# Altium footprint library 13-IC Packages-1bga.PcbLib: 97 footprints (part 2 of 14) (continued)
## BGA78C80P9X13_900X1150X120 [mm] "BGA 0.8mm, Pitch, Square 78 Pin, 9 Columns x 13 Rows, Body 11.5mm X 9mm X 1.2mm H"
height 1.2
pads (80):
  round 0.4 smd: A1(-3.2,4.8) A2(-2.4,4.8) A3(-1.6,4.8) A7(1.6,4.8) A8(2.4,4.8) A9(3.2,4.8) B1(-3.2,4) B2(-2.4,4) B3(-1.6,4) B7(1.6,4) B8(2.4,4) B9(3.2,4) C1(-3.2,3.2) C2(-2.4,3.2) C3(-1.6,3.2) C7(1.6,3.2) C8(2.4,3.2) C9(3.2,3.2) D1(-3.2,2.4) D2(-2.4,2.4) D3(-1.6,2.4) D7(1.6,2.4) D8(2.4,2.4) D9(3.2,2.4) E1(-3.2,1.6) E2(-2.4,1.6) E3(-1.6,1.6) E7(1.6,1.6) E8(2.4,1.6) E9(3.2,1.6) F1(-3.2,0.8) F2(-2.4,0.8) F3(-1.6,0.8) F7(1.6,0.8) F8(2.4,0.8) F9(3.2,0.8) G1(-3.2,0) G2(-2.4,0) G3(-1.6,0) G7(1.6,0) G8(2.4,0) G9(3.2,0) H1(-3.2,-0.8) H2(-2.4,-0.8) H3(-1.6,-0.8) H7(1.6,-0.8) H8(2.4,-0.8) H9(3.2,-0.8) J1(-3.2,-1.6) J2(-2.4,-1.6) J3(-1.6,-1.6) J7(1.6,-1.6) J8(2.4,-1.6) J9(3.2,-1.6) K1(-3.2,-2.4) K2(-2.4,-2.4) K3(-1.6,-2.4) K7(1.6,-2.4) K8(2.4,-2.4) K9(3.2,-2.4) L1(-3.2,-3.2) L2(-2.4,-3.2) L3(-1.6,-3.2) L7(1.6,-3.2) L8(2.4,-3.2) L9(3.2,-3.2) M1(-3.2,-4) M2(-2.4,-4) M3(-1.6,-4) M7(1.6,-4) M8(2.4,-4) M9(3.2,-4) N1(-3.2,-4.8) N2(-2.4,-4.8) N3(-1.6,-4.8) N7(1.6,-4.8) N8(2.4,-4.8) N9(3.2,-4.8)
  round 1 smd paste-0.51 mask+0.5: FTG1(-5.5,-6.75) FTG2(5.5,6.75)
Top Layer keep-out:
  circle w0.1: c5.5,6.75 r1
  circle w0.1: c-5.5,-6.75 r1
Top Overlay:
  circle w0.25: c-5.1,4.8 r0.125
  lines w0.2: -4.5,4.75 -3.5,5.75 ; -4.5,4.95 -3.7,5.75 ; -4.5,5.15 -3.9,5.75 ; -4.5,5.35 -4.1,5.75 ; -4.5,5.55 -4.3,5.75 ; -4.5,-5.75 -4.5,5.75 4.5,5.75 4.5,-5.75 -4.5,-5.75
Mechanical 14:
  lines w0.1: -4.5,4.75 -3.5,5.75 ; -4.5,4.85 -3.6,5.75 ; -4.5,4.95 -3.7,5.75 ; -4.5,5.05 -3.8,5.75 ; -4.5,5.15 -3.9,5.75 ; -4.5,5.25 -4,5.75 ; -4.5,5.35 -4.1,5.75 ; -4.5,5.45 -4.2,5.75 ; -4.5,5.55 -4.3,5.75 ; -4.5,5.65 -4.4,5.75 ; -4.5,-5.75 4.5,-5.75 4.5,5.75 -4.5,5.75 -4.5,-5.75
  text "9" at 3.075,6.075 h0.4
  text "8" at 2.275,6.075 h0.4
  text "7" at 1.475,6.075 h0.4
  text "3" at -1.725,6.075 h0.4
  text "2" at -2.525,6.075 h0.4
  text "1" at -3.325,6.075 h0.4
  text "J" at -4,-1.8 h0.4
  text "N" at -4,-5 h0.4
  text "A" at -4,4.6 h0.4
  text "B" at -4,3.8 h0.4
  text "C" at -4,3 h0.4
  text "D" at -4,2.2 h0.4
  text "E" at -4,1.4 h0.4
  text "F" at -4,0.6 h0.4
  text "G" at -4,-0.2 h0.4
  text "H" at -4,-1 h0.4
  text "M" at -4,-4.2 h0.4
  text "K" at -4,-2.6 h0.4
  text "L" at -4,-3.4 h0.4
Mechanical 15:
  lines w0.05: -0.5,0 0.5,0 ; 0,-0.5 0,0.5 ; -5.5,-6.75 5.5,-6.75 5.5,6.75 -5.5,6.75 -5.5,-6.75
3D body "BGA78C80P9X13_900X1150X120.stp": height 1.2, standoff -0.05, extent -4.5,-5.75 4.5,5.75

## BGA84C80P9X15_800X1250X120 [mm] "BGA, 0.80mm pitch, Rect.; 84 Pin, 9 Columns X 15 Rows, 8.00mm X 12.50mm X 1.20mm H"
height 1.2
pads (86):
  round 0.4 smd: A1(-3.2,5.6) A2(-2.4,5.6) A3(-1.6,5.6) A7(1.6,5.6) A8(2.4,5.6) A9(3.2,5.6) B1(-3.2,4.8) B2(-2.4,4.8) B3(-1.6,4.8) B7(1.6,4.8) B8(2.4,4.8) B9(3.2,4.8) C1(-3.2,4) C2(-2.4,4) C3(-1.6,4) C7(1.6,4) C8(2.4,4) C9(3.2,4) D1(-3.2,3.2) D2(-2.4,3.2) D3(-1.6,3.2) D7(1.6,3.2) D8(2.4,3.2) D9(3.2,3.2) E1(-3.2,2.4) E2(-2.4,2.4) E3(-1.6,2.4) E7(1.6,2.4) E8(2.4,2.4) E9(3.2,2.4) F1(-3.2,1.6) F2(-2.4,1.6) F3(-1.6,1.6) F7(1.6,1.6) F8(2.4,1.6) F9(3.2,1.6) G1(-3.2,0.8) G2(-2.4,0.8) G3(-1.6,0.8) G7(1.6,0.8) G8(2.4,0.8) G9(3.2,0.8) H1(-3.2,0) H2(-2.4,0) H3(-1.6,0) H7(1.6,0) H8(2.4,0) H9(3.2,0) J1(-3.2,-0.8) J2(-2.4,-0.8) J3(-1.6,-0.8) J7(1.6,-0.8) J8(2.4,-0.8) J9(3.2,-0.8) K2(-2.4,-1.6) K3(-1.6,-1.6) K7(1.6,-1.6) K8(2.4,-1.6) K9(3.2,-1.6) L1(-3.2,-2.4) L2(-2.4,-2.4) L3(-1.6,-2.4) L7(1.6,-2.4) L8(2.4,-2.4) M2(-2.4,-3.2) M3(-1.6,-3.2) M7(1.6,-3.2) M8(2.4,-3.2) M9(3.2,-3.2) N1(-3.2,-4) N2(-2.4,-4) N3(-1.6,-4) N7(1.6,-4) N8(2.4,-4) P2(-2.4,-4.8) P3(-1.6,-4.8) P7(1.6,-4.8) P8(2.4,-4.8) P9(3.2,-4.8) R1(-3.2,-5.6) R2(-2.4,-5.6) R3(-1.6,-5.6) R7(1.6,-5.6) R8(2.4,-5.6)
  round 1 smd paste-0.51 mask+0.5: FTG1(-4.85,-7.1) FTG2(4.85,7.1)
Top Layer keep-out:
  circle w0.1: c-4.85,-7.1 r1
  circle w0.1: c4.85,7.1 r1
Top Overlay:
  circle w0.25: c-4.6,5.6 r0.125
  lines w0.2: -4,-6.25 4,-6.25 4,6.25 -4,6.25 -4,-6.25
Mechanical 14:
  lines w0.1: -4,5.25 -3,6.25 ; -4,5.35 -3.1,6.25 ; -4,5.45 -3.2,6.25 ; -4,5.55 -3.3,6.25 ; -4,5.65 -3.4,6.25 ; -4,5.75 -3.5,6.25 ; -4,5.85 -3.6,6.25 ; -4,5.95 -3.7,6.25 ; -4,6.05 -3.8,6.25 ; -4,6.15 -3.9,6.25 ; -4,-6.25 4,-6.25 4,6.25 -4,6.25 -4,-6.25
Mechanical 15:
  circle w0.05: c0,0 r0.35
  lines w0.05: -0.5,0 0.5,0 ; 0,-0.5 0,0.5 ; -5.05,-7.3 5.05,-7.3 5.05,7.3 -5.05,7.3 -5.05,-7.3
3D body "BGA84C80P9X15_800X1250X120.stp": height 1.2, standoff 0, extent -4,-6.25 4,6.25

## BGA84C80P9X15_1400X800X120 [mm] "BGA 0.8mm, Pitch, Square 84 Pin, 9 Columns x 15 Rows, Body 14mm X 8mm X 1.2mm H"
height 1.2
pads (86):
  round 0.4 smd: A1(-3.2,5.6) A2(-2.4,5.6) A3(-1.6,5.6) A7(1.6,5.6) A8(2.4,5.6) A9(3.2,5.6) B1(-3.2,4.8) B2(-2.4,4.8) B3(-1.6,4.8) B7(1.6,4.8) B8(2.4,4.8) B9(3.2,4.8) C1(-3.2,4) C2(-2.4,4) C3(-1.6,4) C7(1.6,4) C8(2.4,4) C9(3.2,4) D1(-3.2,3.2) D2(-2.4,3.2) D3(-1.6,3.2) D7(1.6,3.2) D8(2.4,3.2) D9(3.2,3.2) E1(-3.2,2.4) E2(-2.4,2.4) E3(-1.6,2.4) E7(1.6,2.4) E8(2.4,2.4) E9(3.2,2.4) F1(-3.2,1.6) F2(-2.4,1.6) F3(-1.6,1.6) F7(1.6,1.6) F8(2.4,1.6) F9(3.2,1.6) G1(-3.2,0.8) G2(-2.4,0.8) G3(-1.6,0.8) G7(1.6,0.8) G8(2.4,0.8) G9(3.2,0.8) H1(-3.2,0) H2(-2.4,0) H3(-1.6,0) H7(1.6,0) H8(2.4,0) H9(3.2,0) J1(-3.2,-0.8) J2(-2.4,-0.8) J3(-1.6,-0.8) J7(1.6,-0.8) J8(2.4,-0.8) J9(3.2,-0.8) K2(-2.4,-1.6) K3(-1.6,-1.6) K7(1.6,-1.6) K8(2.4,-1.6) K9(3.2,-1.6) L1(-3.2,-2.4) L2(-2.4,-2.4) L3(-1.6,-2.4) L7(1.6,-2.4) L8(2.4,-2.4) M2(-2.4,-3.2) M3(-1.6,-3.2) M7(1.6,-3.2) M8(2.4,-3.2) M9(3.2,-3.2) N1(-3.2,-4) N2(-2.4,-4) N3(-1.6,-4) N7(1.6,-4) N8(2.4,-4) P2(-2.4,-4.8) P3(-1.6,-4.8) P7(1.6,-4.8) P8(2.4,-4.8) P9(3.2,-4.8) R1(-3.2,-5.6) R2(-2.4,-5.6) R3(-1.6,-5.6) R7(1.6,-5.6) R8(2.4,-5.6)
  round 1 smd paste-0.51 mask+0.5: FTG1(-5,-8) FTG2(5,8)
Top Layer keep-out:
  circle w0.1: c-5,-8 r1
  circle w0.1: c5,8 r1
Top Overlay:
  circle w0.25: c-4.5,6.5 r0.125
  region: -3,7 -4,6 -4,7
  lines w0.2: -4,6 -3,7 ; -4,-7 4,-7 4,7 -4,7 -4,-7
Mechanical 14:
  circle w0.25: c-4.5,6.5 r0.125
  region: -3,7 -4,6 -4,7
  lines w0.1: -4,-7 4,-7 4,7 -4,7 -4,-7
  text "L" at -4.5,-2.4 h0.4
  text "K" at -4.5,-1.6 h0.4
  text "M" at -4.5,-3.2 h0.4
  text "H" at -4.5,0 h0.4
  text "G" at -4.5,0.8 h0.4
  text "F" at -4.5,1.6 h0.4
  text "E" at -4.5,2.4 h0.4
  text "D" at -4.5,3.2 h0.4
  text "C" at -4.5,4 h0.4
  text "B" at -4.5,4.8 h0.4
  text "A" at -4.5,5.6 h0.4
  text "N" at -4.5,-4 h0.4
  text "P" at -4.5,-4.8 h0.4
  text "R" at -4.5,-5.6 h0.4
  text "J" at -4.5,-0.8 h0.4
  text "1" at -3.325,7.175 h0.4
  text "2" at -2.525,7.175 h0.4
  text "3" at -1.725,7.175 h0.4
  text "7" at 1.475,7.175 h0.4
  text "8" at 2.275,7.175 h0.4
  text "9" at 3.075,7.175 h0.4
Mechanical 15:
  lines w0.05: -5,-8 5,-8 5,8 -5,8 -5,-8
3D body "BGA84C80P9X15_1400X800X120.stp": height 1.2, standoff 0, extent -4.075,-7.075 4.075,7.075

## BGA96C80P9X16_800X1400X120 [mm] "BGA, 0.80mm Pitch, Rect.; 96 Pin, 9 Columns X 16 Rows, 8.00mm X 14.00mm X 1.20mm H"
height 1.2
pads (98):
  round 0.4 smd: A1(-3.2,6) A2(-2.4,6) A3(-1.6,6) A7(1.6,6) A8(2.4,6) A9(3.2,6) B1(-3.2,5.2) B2(-2.4,5.2) B3(-1.6,5.2) B7(1.6,5.2) B8(2.4,5.2) B9(3.2,5.2) C1(-3.2,4.4) C2(-2.4,4.4) C3(-1.6,4.4) C7(1.6,4.4) C8(2.4,4.4) C9(3.2,4.4) D1(-3.2,3.6) D2(-2.4,3.6) D3(-1.6,3.6) D7(1.6,3.6) D8(2.4,3.6) D9(3.2,3.6) E1(-3.2,2.8) E2(-2.4,2.8) E3(-1.6,2.8) E7(1.6,2.8) E8(2.4,2.8) E9(3.2,2.8) F1(-3.2,2) F2(-2.4,2) F3(-1.6,2) F7(1.6,2) F8(2.4,2) F9(3.2,2) G1(-3.2,1.2) G2(-2.4,1.2) G3(-1.6,1.2) G7(1.6,1.2) G8(2.4,1.2) G9(3.2,1.2) H1(-3.2,0.4) H2(-2.4,0.4) H3(-1.6,0.4) H7(1.6,0.4) H8(2.4,0.4) H9(3.2,0.4) J1(-3.2,-0.4) J2(-2.4,-0.4) J3(-1.6,-0.4) J7(1.6,-0.4) J8(2.4,-0.4) J9(3.2,-0.4) K1(-3.2,-1.2) K2(-2.4,-1.2) K3(-1.6,-1.2) K7(1.6,-1.2) K8(2.4,-1.2) K9(3.2,-1.2) L1(-3.2,-2) L2(-2.4,-2) L3(-1.6,-2) L7(1.6,-2) L8(2.4,-2) L9(3.2,-2) M1(-3.2,-2.8) M2(-2.4,-2.8) M3(-1.6,-2.8) M7(1.6,-2.8) M8(2.4,-2.8) M9(3.2,-2.8) N1(-3.2,-3.6) N2(-2.4,-3.6) N3(-1.6,-3.6) N7(1.6,-3.6) N8(2.4,-3.6) N9(3.2,-3.6) P1(-3.2,-4.4) P2(-2.4,-4.4) P3(-1.6,-4.4) P7(1.6,-4.4) P8(2.4,-4.4) P9(3.2,-4.4) R1(-3.2,-5.2) R2(-2.4,-5.2) R3(-1.6,-5.2) R7(1.6,-5.2) R8(2.4,-5.2) R9(3.2,-5.2) T1(-3.2,-6) T2(-2.4,-6) T3(-1.6,-6) T7(1.6,-6) T8(2.4,-6) T9(3.2,-6)
  round 1 smd paste-0.51 mask+0.5: FTG1(-4.85,-7.85) FTG2(4.85,7.85)
Top Layer keep-out:
  circle w0.1: c-4.85,-7.85 r1
  circle w0.1: c4.85,7.85 r1
Top Overlay:
  circle w0.25: c-4.6,6 r0.125
  lines w0.2: -4,6 -3,7 ; -4,6.2 -3.2,7 ; -4,6.4 -3.4,7 ; -4,6.6 -3.6,7 ; -4,6.8 -3.8,7 ; -4,-7 4,-7 4,7 -4,7 -4,-7
Mechanical 14:
  lines w0.1: -4,6 -3,7 ; -4,6.1 -3.1,7 ; -4,6.2 -3.2,7 ; -4,6.3 -3.3,7 ; -4,6.4 -3.4,7 ; -4,6.5 -3.5,7 ; -4,6.6 -3.6,7 ; -4,6.7 -3.7,7 ; -4,6.8 -3.8,7 ; -4,6.9 -3.9,7 ; -4,-7 4,-7 4,7 -4,7 -4,-7
  text "L" at -4.6,-2.2 h0.4
  text "K" at -4.6,-1.4 h0.4
  text "M" at -4.6,-3 h0.4
  text "H" at -4.6,0.2 h0.4
  text "G" at -4.6,1 h0.4
  text "F" at -4.6,1.8 h0.4
  text "E" at -4.6,2.6 h0.4
  text "D" at -4.6,3.4 h0.4
  text "C" at -4.6,4.2 h0.4
  text "B" at -4.6,5 h0.4
  text "N" at -4.6,-3.8 h0.4
  text "P" at -4.6,-4.6 h0.4
  text "R" at -4.6,-5.4 h0.4
  text "J" at -4.6,-0.6 h0.4
  text "T" at -4.6,-6.2 h0.4
  text "1" at -3.325,7.275 h0.4
  text "2" at -2.525,7.275 h0.4
  text "3" at -1.725,7.275 h0.4
  text "7" at 1.475,7.275 h0.4
  text "8" at 2.275,7.275 h0.4
  text "9" at 3.075,7.275 h0.4
Mechanical 15:
  circle w0.05: c0,0 r0.35
  lines w0.05: -0.5,0 0.5,0 ; 0,-0.5 0,0.5 ; -5.05,-8.05 5.05,-8.05 5.05,8.05 -5.05,8.05 -5.05,-8.05
Mechanical 21:
  lines w0.001: -4,-7 4,-7 4,7 -4,7 -4,-7
3D body "BGA96C80P9X16_800X1400X120.stp": height 1.2, standoff 0, extent -4.075,-7.075 4.075,7.075

## BGA96C80P9X16_900X1400X120 [mm] "BGA 0.8mm, Pitch, Square 96 Pin, 9 Columns x 16 Rows, Body 14mm X 9mm X 1.2mm H"
height 1.2
pads (98):
  round 0.4 smd: A1(-3.2,6) A2(-2.4,6) A3(-1.6,6) A7(1.6,6) A8(2.4,6) A9(3.2,6) B1(-3.2,5.2) B2(-2.4,5.2) B3(-1.6,5.2) B7(1.6,5.2) B8(2.4,5.2) B9(3.2,5.2) C1(-3.2,4.4) C2(-2.4,4.4) C3(-1.6,4.4) C7(1.6,4.4) C8(2.4,4.4) C9(3.2,4.4) D1(-3.2,3.6) D2(-2.4,3.6) D3(-1.6,3.6) D7(1.6,3.6) D8(2.4,3.6) D9(3.2,3.6) E1(-3.2,2.8) E2(-2.4,2.8) E3(-1.6,2.8) E7(1.6,2.8) E8(2.4,2.8) E9(3.2,2.8) F1(-3.2,2) F2(-2.4,2) F3(-1.6,2) F7(1.6,2) F8(2.4,2) F9(3.2,2) G1(-3.2,1.2) G2(-2.4,1.2) G3(-1.6,1.2) G7(1.6,1.2) G8(2.4,1.2) G9(3.2,1.2) H1(-3.2,0.4) H2(-2.4,0.4) H3(-1.6,0.4) H7(1.6,0.4) H8(2.4,0.4) H9(3.2,0.4) J1(-3.2,-0.4) J2(-2.4,-0.4) J3(-1.6,-0.4) J7(1.6,-0.4) J8(2.4,-0.4) J9(3.2,-0.4) K1(-3.2,-1.2) K2(-2.4,-1.2) K3(-1.6,-1.2) K7(1.6,-1.2) K8(2.4,-1.2) K9(3.2,-1.2) L1(-3.2,-2) L2(-2.4,-2) L3(-1.6,-2) L7(1.6,-2) L8(2.4,-2) L9(3.2,-2) M1(-3.2,-2.8) M2(-2.4,-2.8) M3(-1.6,-2.8) M7(1.6,-2.8) M8(2.4,-2.8) M9(3.2,-2.8) N1(-3.2,-3.6) N2(-2.4,-3.6) N3(-1.6,-3.6) N7(1.6,-3.6) N8(2.4,-3.6) N9(3.2,-3.6) P1(-3.2,-4.4) P2(-2.4,-4.4) P3(-1.6,-4.4) P7(1.6,-4.4) P8(2.4,-4.4) P9(3.2,-4.4) R1(-3.2,-5.2) R2(-2.4,-5.2) R3(-1.6,-5.2) R7(1.6,-5.2) R8(2.4,-5.2) R9(3.2,-5.2) T1(-3.2,-6) T2(-2.4,-6) T3(-1.6,-6) T7(1.6,-6) T8(2.4,-6) T9(3.2,-6)
  round 1 smd paste-0.51 mask+0.5: FTG1(-5.35,-7.85) FTG2(5.35,7.85)
Top Layer keep-out:
  circle w0.1: c-5.35,-7.85 r1
  circle w0.1: c5.35,7.85 r1
Top Overlay:
  circle w0.25: c-5.1,6 r0.125
  lines w0.2: -4.5,6 -3.5,7 ; -4.5,6.2 -3.7,7 ; -4.5,6.4 -3.9,7 ; -4.5,6.6 -4.1,7 ; -4.5,6.8 -4.3,7 ; -4.5,-7 -4.5,7 4.5,7 4.5,-7 -4.5,-7
Mechanical 14:
  lines w0.1: -4.5,6 -3.5,7 ; -4.5,6.1 -3.6,7 ; -4.5,6.2 -3.7,7 ; -4.5,6.3 -3.8,7 ; -4.5,6.4 -3.9,7 ; -4.5,6.5 -4,7 ; -4.5,6.6 -4.1,7 ; -4.5,6.7 -4.2,7 ; -4.5,6.8 -4.3,7 ; -4.5,6.9 -4.4,7 ; -4.5,-7 -4.5,7 4.5,7 4.5,-7 -4.5,-7
  text "1" at -3.325,7.275 h0.4
  text "2" at -2.525,7.275 h0.4
  text "3" at -1.725,7.275 h0.4
  text "7" at 1.475,7.275 h0.4
  text "8" at 2.275,7.275 h0.4
  text "9" at 3.075,7.275 h0.4
  text "L" at -5.1,-2.2 h0.4
  text "K" at -5.1,-1.4 h0.4
  text "M" at -5.1,-3 h0.4
  text "H" at -5.1,0.2 h0.4
  text "G" at -5.1,1 h0.4
  text "F" at -5.1,1.8 h0.4
  text "E" at -5.1,2.6 h0.4
  text "D" at -5.1,3.4 h0.4
  text "C" at -5.1,4.2 h0.4
  text "B" at -5.1,5 h0.4
  text "N" at -5.1,-3.8 h0.4
  text "P" at -5.1,-4.6 h0.4
  text "R" at -5.1,-5.4 h0.4
  text "J" at -5.1,-0.6 h0.4
  text "T" at -5.1,-6.2 h0.4
Mechanical 15:
  lines w0.05: -0.5,0 0.5,0 ; 0,-0.5 0,0.5 ; -5.5,-8 -5.5,8 5.5,8 5.5,-8 -5.5,-8
3D body "BGA96C80P9X16_900X1400X120.stp": height 1.2, standoff 0, extent -4.575,-7.075 4.575,7.075

## BGA100C80P10X10_900X900X150 [mm] "BGA, 0.80mm Pitch, Square; 100 Pin, 10 Columns X 10 Rows, 9.00mm X 9.00mm X 1.50mm H"
height 1.5
pads (102):
  round 0.45 smd: A1(-3.6,3.6) A2(-2.8,3.6) A3(-2,3.6) A4(-1.2,3.6) A5(-0.4,3.6) A6(0.4,3.6) A7(1.2,3.6) A8(2,3.6) A9(2.8,3.6) A10(3.6,3.6) B1(-3.6,2.8) B2(-2.8,2.8) B3(-2,2.8) B4(-1.2,2.8) B5(-0.4,2.8) B6(0.4,2.8) B7(1.2,2.8) B8(2,2.8) B9(2.8,2.8) B10(3.6,2.8) C1(-3.6,2) C2(-2.8,2) C3(-2,2) C4(-1.2,2) C5(-0.4,2) C6(0.4,2) C7(1.2,2) C8(2,2) C9(2.8,2) C10(3.6,2) D1(-3.6,1.2) D2(-2.8,1.2) D3(-2,1.2) D4(-1.2,1.2) D5(-0.4,1.2) D6(0.4,1.2) D7(1.2,1.2) D8(2,1.2) D9(2.8,1.2) D10(3.6,1.2) E1(-3.6,0.4) E2(-2.8,0.4) E3(-2,0.4) E4(-1.2,0.4) E5(-0.4,0.4) E6(0.4,0.4) E7(1.2,0.4) E8(2,0.4) E9(2.8,0.4) E10(3.6,0.4) F1(-3.6,-0.4) F2(-2.8,-0.4) F3(-2,-0.4) F4(-1.2,-0.4) F5(-0.4,-0.4) F6(0.4,-0.4) F7(1.2,-0.4) F8(2,-0.4) F9(2.8,-0.4) F10(3.6,-0.4) G1(-3.6,-1.2) G2(-2.8,-1.2) G3(-2,-1.2) G4(-1.2,-1.2) G5(-0.4,-1.2) G6(0.4,-1.2) G7(1.2,-1.2) G8(2,-1.2) G9(2.8,-1.2) G10(3.6,-1.2) H1(-3.6,-2) H2(-2.8,-2) H3(-2,-2) H4(-1.2,-2) H5(-0.4,-2) H6(0.4,-2) H7(1.2,-2) H8(2,-2) H9(2.8,-2) H10(3.6,-2) J1(-3.6,-2.8) J2(-2.8,-2.8) J3(-2,-2.8) J4(-1.2,-2.8) J5(-0.4,-2.8) J6(0.4,-2.8) J7(1.2,-2.8) J8(2,-2.8) J9(2.8,-2.8) J10(3.6,-2.8) K1(-3.6,-3.6) K2(-2.8,-3.6) K3(-2,-3.6) K4(-1.2,-3.6) K5(-0.4,-3.6) K6(0.4,-3.6) K7(1.2,-3.6) K8(2,-3.6) K9(2.8,-3.6) K10(3.6,-3.6)
  round 1 smd paste-0.51 mask+0.5: FTG1(-5.35,-5.35) FTG2(5.35,5.35)
Top Layer keep-out:
  circle w0.1: c5.35,5.35 r1
  circle w0.1: c-5.35,-5.35 r1
Top Overlay:
  circle w0.25: c-5.1,3.6 r0.125
  lines w0.2: -4.5,3.5 -3.5,4.5 ; -4.5,3.7 -3.7,4.5 ; -4.5,3.9 -3.9,4.5 ; -4.5,4.1 -4.1,4.5 ; -4.5,4.3 -4.3,4.5 ; -4.5,-4.5 -4.5,4.5 4.5,4.5 4.5,-4.5 -4.5,-4.5
Mechanical 14:
  lines w0.1: -4.5,3.5 -3.5,4.5 ; -4.5,3.6 -3.6,4.5 ; -4.5,3.7 -3.7,4.5 ; -4.5,3.8 -3.8,4.5 ; -4.5,3.9 -3.9,4.5 ; -4.5,4 -4,4.5 ; -4.5,4.1 -4.1,4.5 ; -4.5,4.2 -4.2,4.5 ; -4.5,4.3 -4.3,4.5 ; -4.5,4.4 -4.4,4.5 ; -4.5,-4.5 -4.5,4.5 4.5,4.5 4.5,-4.5 -4.5,-4.5
Mechanical 15:
  circle w0.05: c0,0 r0.35
  lines w0.05: -0.5,0 0.5,0 ; 0,-0.5 0,0.5 ; -5.5,-5.5 -5.5,5.5 5.5,5.5 5.5,-5.5 -5.5,-5.5
3D body "BGA100C80P10X10_900X900X150.stp": height 1.8, standoff 0, extent -4.5,-4.5 4.5,4.5

## BGA100C80P10X10_1000X1000X150 [mm] "BGA, 0.80mm pitch, square; 100 pin, 10 columns X 10 rows, 10.00mm X 10.00mm X 1.50mm H"
height 1.5
pads (102):
  round 0.4 smd: A1(-3.6,3.6) A2(-2.8,3.6) A3(-2,3.6) A4(-1.2,3.6) A5(-0.4,3.6) A6(0.4,3.6) A7(1.2,3.6) A8(2,3.6) A9(2.8,3.6) A10(3.6,3.6) B1(-3.6,2.8) B2(-2.8,2.8) B3(-2,2.8) B4(-1.2,2.8) B5(-0.4,2.8) B6(0.4,2.8) B7(1.2,2.8) B8(2,2.8) B9(2.8,2.8) B10(3.6,2.8) C1(-3.6,2) C2(-2.8,2) C3(-2,2) C4(-1.2,2) C5(-0.4,2) C6(0.4,2) C7(1.2,2) C8(2,2) C9(2.8,2) C10(3.6,2) D1(-3.6,1.2) D2(-2.8,1.2) D3(-2,1.2) D4(-1.2,1.2) D5(-0.4,1.2) D6(0.4,1.2) D7(1.2,1.2) D8(2,1.2) D9(2.8,1.2) D10(3.6,1.2) E1(-3.6,0.4) E2(-2.8,0.4) E3(-2,0.4) E4(-1.2,0.4) E5(-0.4,0.4) E6(0.4,0.4) E7(1.2,0.4) E8(2,0.4) E9(2.8,0.4) E10(3.6,0.4) F1(-3.6,-0.4) F2(-2.8,-0.4) F3(-2,-0.4) F4(-1.2,-0.4) F5(-0.4,-0.4) F6(0.4,-0.4) F7(1.2,-0.4) F8(2,-0.4) F9(2.8,-0.4) F10(3.6,-0.4) G1(-3.6,-1.2) G2(-2.8,-1.2) G3(-2,-1.2) G4(-1.2,-1.2) G5(-0.4,-1.2) G6(0.4,-1.2) G7(1.2,-1.2) G8(2,-1.2) G9(2.8,-1.2) G10(3.6,-1.2) H1(-3.6,-2) H2(-2.8,-2) H3(-2,-2) H4(-1.2,-2) H5(-0.4,-2) H6(0.4,-2) H7(1.2,-2) H8(2,-2) H9(2.8,-2) H10(3.6,-2) J1(-3.6,-2.8) J2(-2.8,-2.8) J3(-2,-2.8) J4(-1.2,-2.8) J5(-0.4,-2.8) J6(0.4,-2.8) J7(1.2,-2.8) J8(2,-2.8) J9(2.8,-2.8) J10(3.6,-2.8) K1(-3.6,-3.6) K2(-2.8,-3.6) K3(-2,-3.6) K4(-1.2,-3.6) K5(-0.4,-3.6) K6(0.4,-3.6) K7(1.2,-3.6) K8(2,-3.6) K9(2.8,-3.6) K10(3.6,-3.6)
  round 1 smd paste-0.51 mask+0.5: FTG1(-5.85,-5.85) FTG2(5.85,5.85)
Top Layer keep-out:
  circle w0.1: c-5.85,-5.85 r1
  circle w0.1: c5.85,5.85 r1
Top Overlay:
  circle w0.25: c-5.625,4.3 r0.125
  lines w0.2: -5,4 -4,5 ; -5,4.2 -4.2,5 ; -5,4.4 -4.4,5 ; -5,4.6 -4.6,5 ; -5,4.8 -4.8,5 ; -5,-5 5,-5 5,5 -5,5 -5,-5
Mechanical 14:
  lines w0.1: -5,4 -4,5 ; -5,4.1 -4.1,5 ; -5,4.2 -4.2,5 ; -5,4.3 -4.3,5 ; -5,4.4 -4.4,5 ; -5,4.5 -4.5,5 ; -5,4.6 -4.6,5 ; -5,4.7 -4.7,5 ; -5,4.8 -4.8,5 ; -5,4.9 -4.9,5 ; -5,-5 5,-5 5,5 -5,5 -5,-5
  text "K" at -5.7,-3.775 h0.6
  text "H" at -5.7,-2.175 h0.6
  text "G" at -5.7,-1.375 h0.6
  text "F" at -5.7,-0.575 h0.6
  text "E" at -5.7,0.225 h0.6
  text "D" at -5.7,1.025 h0.6
  text "C" at -5.7,1.825 h0.6
  text "B" at -5.7,2.625 h0.6
  text "A" at -5.7,3.425 h0.6
  text "J" at -5.7,-2.975 h0.6
  text "2" at -3.025,5.3 h0.6
  text "1" at -3.725,5.3 h0.6
  text "3" at -2.125,5.3 h0.6
  text "4" at -1.325,5.3 h0.6
  text "5" at -0.525,5.3 h0.6
  text "6" at 0.275,5.3 h0.6
  text "7" at 1.075,5.3 h0.6
  text "8" at 1.875,5.3 h0.6
  text "9" at 2.675,5.3 h0.6
  text "10" at 3.475,5.3 h0.6
Mechanical 15:
  circle w0.05: c0,0 r0.35
  lines w0.05: -0.5,0 0.5,0 ; 0,-0.5 0,0.5 ; -6.1,-6.1 6.1,-6.1 6.1,6.1 -6.1,6.1 -6.1,-6.1
3D body "BGA100C80P10X10_1000X1000X150.stp": height 1.8, standoff 0, extent -5,-5 5,5

## BGA100C100P10X10_1100X1100X155 [mm] "BGA, 1.00mm Pitch, Square; 100 Pin, 10 Columns X 10 Rows, 11.00mm X 11.00mm X 1.55mm H"
height 1.55
pads (102):
  round 0.45 smd: A1(-4.5,4.5) A2(-3.5,4.5) A3(-2.5,4.5) A4(-1.5,4.5) A5(-0.5,4.5) A6(0.5,4.5) A7(1.5,4.5) A8(2.5,4.5) A9(3.5,4.5) A10(4.5,4.5) B1(-4.5,3.5) B2(-3.5,3.5) B3(-2.5,3.5) B4(-1.5,3.5) B5(-0.5,3.5) B6(0.5,3.5) B7(1.5,3.5) B8(2.5,3.5) B9(3.5,3.5) B10(4.5,3.5) C1(-4.5,2.5) C2(-3.5,2.5) C3(-2.5,2.5) C4(-1.5,2.5) C5(-0.5,2.5) C6(0.5,2.5) C7(1.5,2.5) C8(2.5,2.5) C9(3.5,2.5) C10(4.5,2.5) D1(-4.5,1.5) D2(-3.5,1.5) D3(-2.5,1.5) D4(-1.5,1.5) D5(-0.5,1.5) D6(0.5,1.5) D7(1.5,1.5) D8(2.5,1.5) D9(3.5,1.5) D10(4.5,1.5) E1(-4.5,0.5) E2(-3.5,0.5) E3(-2.5,0.5) E4(-1.5,0.5) E5(-0.5,0.5) E6(0.5,0.5) E7(1.5,0.5) E8(2.5,0.5) E9(3.5,0.5) E10(4.5,0.5) F1(-4.5,-0.5) F2(-3.5,-0.5) F3(-2.5,-0.5) F4(-1.5,-0.5) F5(-0.5,-0.5) F6(0.5,-0.5) F7(1.5,-0.5) F8(2.5,-0.5) F9(3.5,-0.5) F10(4.5,-0.5) G1(-4.5,-1.5) G2(-3.5,-1.5) G3(-2.5,-1.5) G4(-1.5,-1.5) G5(-0.5,-1.5) G6(0.5,-1.5) G7(1.5,-1.5) G8(2.5,-1.5) G9(3.5,-1.5) G10(4.5,-1.5) H1(-4.5,-2.5) H2(-3.5,-2.5) H3(-2.5,-2.5) H4(-1.5,-2.5) H5(-0.5,-2.5) H6(0.5,-2.5) H7(1.5,-2.5) H8(2.5,-2.5) H9(3.5,-2.5) H10(4.5,-2.5) J1(-4.5,-3.5) J2(-3.5,-3.5) J3(-2.5,-3.5) J4(-1.5,-3.5) J5(-0.5,-3.5) J6(0.5,-3.5) J7(1.5,-3.5) J8(2.5,-3.5) J9(3.5,-3.5) J10(4.5,-3.5) K1(-4.5,-4.5) K2(-3.5,-4.5) K3(-2.5,-4.5) K4(-1.5,-4.5) K5(-0.5,-4.5) K6(0.5,-4.5) K7(1.5,-4.5) K8(2.5,-4.5) K9(3.5,-4.5) K10(4.5,-4.5)
  round 1 smd paste-0.51 mask+0.5: FTG1(-6.35,-6.35) FTG2(6.35,6.35)
Top Layer keep-out:
  circle w0.1: c6.35,6.35 r1
  circle w0.1: c-6.35,-6.35 r1
Top Overlay:
  circle w0.25: c-6.2,5.225 r0.125
  lines w0.2: -5.5,4.5 -4.5,5.5 ; -5.5,4.7 -4.7,5.5 ; -5.5,4.9 -4.9,5.5 ; -5.5,5.1 -5.1,5.5 ; -5.5,5.3 -5.3,5.5 ; -5.5,-5.5 -5.5,5.5 5.5,5.5 5.5,-5.5 -5.5,-5.5
Mechanical 14:
  lines w0.1: -5.5,4.5 -4.5,5.5 ; -5.5,4.6 -4.6,5.5 ; -5.5,4.7 -4.7,5.5 ; -5.5,4.8 -4.8,5.5 ; -5.5,4.9 -4.9,5.5 ; -5.5,5 -5,5.5 ; -5.5,5.1 -5.1,5.5 ; -5.5,5.2 -5.2,5.5 ; -5.5,5.3 -5.3,5.5 ; -5.5,5.4 -5.4,5.5 ; -5.5,-5.5 -5.5,5.5 5.5,5.5 5.5,-5.5 -5.5,-5.5
  text "1" at -4.175,5.9 h0.6
  text "6" at 0.775,5.9 h0.6
  text "7" at 1.775,5.9 h0.6
  text "8" at 2.75,5.9 h0.6
  text "9" at 3.825,5.9 h0.6
  text "10" at 4.625,5.9 h0.6
  text "5" at -0.225,5.9 h0.6
  text "4" at -1.225,5.9 h0.6
  text "3" at -2.225,5.9 h0.6
  text "2" at -3.225,5.9 h0.6
  text "A" at -6.3,4.2 h0.6
  text "B" at -6.3,3.2 h0.6
  text "C" at -6.3,2.2 h0.6
  text "D" at -6.3,1.2 h0.6
  text "E" at -6.3,0.2 h0.6
  text "F" at -6.3,-0.8 h0.6
  text "G" at -6.3,-1.8 h0.6
  text "H" at -6.3,-2.8 h0.6
  text "J" at -6.3,-3.8 h0.6
  text "K" at -6.3,-4.8 h0.6
Mechanical 15:
  circle w0.05: c0,0 r0.35
  lines w0.05: -0.5,0 0.5,0 ; 0,-0.5 0,0.5 ; -6.5,-6.5 -6.5,6.5 6.5,6.5 6.5,-6.5 -6.5,-6.5
3D body "BGA100C100P10X10_1100X1100X155.stp": height 1.55, standoff 0, extent -5.5,-5.5 5.5,5.5

## BGA117C100P9X13_1000X1400X154 [mm] "BGA,1.00mm pitch,rect.;117 pin,9 columns X 13 rows,10.00mm X 14.00mm X 1.54mm H"
height 1.54
pads (119):
  round 0.5 smd: A1(-4,6) A2(-3,6) A3(-2,6) A4(-1,6) A5(0,6) A6(1,6) A7(2,6) A8(3,6) A9(4,6) B1(-4,5) B2(-3,5) B3(-2,5) B4(-1,5) B5(0,5) B6(1,5) B7(2,5) B8(3,5) B9(4,5) C1(-4,4) C2(-3,4) C3(-2,4) C4(-1,4) C5(0,4) C6(1,4) C7(2,4) C8(3,4) C9(4,4) D1(-4,3) D2(-3,3) D3(-2,3) D4(-1,3) D5(0,3) D6(1,3) D7(2,3) D8(3,3) D9(4,3) E1(-4,2) E2(-3,2) E3(-2,2) E4(-1,2) E5(0,2) E6(1,2) E7(2,2) E8(3,2) E9(4,2) F1(-4,1) F2(-3,1) F3(-2,1) F4(-1,1) F5(0,1) F6(1,1) F7(2,1) F8(3,1) F9(4,1) G1(-4,0) G2(-3,0) G3(-2,0) G4(-1,0) G5(0,0) G6(1,0) G7(2,0) G8(3,0) G9(4,0) H1(-4,-1) H2(-3,-1) H3(-2,-1) H4(-1,-1) H5(0,-1) H6(1,-1) H7(2,-1) H8(3,-1) H9(4,-1) J1(-4,-2) J2(-3,-2) J3(-2,-2) J4(-1,-2) J5(0,-2) J6(1,-2) J7(2,-2) J8(3,-2) J9(4,-2) K1(-4,-3) K2(-3,-3) K3(-2,-3) K4(-1,-3) K5(0,-3) K6(1,-3) K7(2,-3) K8(3,-3) K9(4,-3) L1(-4,-4) L2(-3,-4) L3(-2,-4) L4(-1,-4) L5(0,-4) L6(1,-4) L7(2,-4) L8(3,-4) L9(4,-4) M1(-4,-5) M2(-3,-5) M3(-2,-5) M4(-1,-5) M5(0,-5) M6(1,-5) M7(2,-5) M8(3,-5) M9(4,-5) N1(-4,-6) N2(-3,-6) N3(-2,-6) N4(-1,-6) N5(0,-6) N6(1,-6) N7(2,-6) N8(3,-6) N9(4,-6)
  round 1 smd paste-0.51 mask+0.5: FTG1(-5.85,-7.85) FTG2(5.85,7.85)
Top Layer keep-out:
  circle w0.1: c5.85,7.85 r1
  circle w0.1: c-5.85,-7.85 r1
Top Overlay:
  circle w0.25: c-5.6,6 r0.125
  lines w0.2: -5,6 -4,7 ; -5,6.2 -4.2,7 ; -5,6.4 -4.4,7 ; -5,6.6 -4.6,7 ; -5,6.8 -4.8,7 ; -5,-7 -5,7 5,7 5,-7 -5,-7
Mechanical 14:
  lines w0.1: -5,6 -4,7 ; -5,6.1 -4.1,7 ; -5,6.2 -4.2,7 ; -5,6.3 -4.3,7 ; -5,6.4 -4.4,7 ; -5,6.5 -4.5,7 ; -5,6.6 -4.6,7 ; -5,6.7 -4.7,7 ; -5,6.8 -4.8,7 ; -5,6.9 -4.9,7 ; -5,-7 -5,7 5,7 5,-7 -5,-7
Mechanical 15:
  circle w0.05: c0,0 r0.35
  lines w0.05: -0.5,0 0.5,0 ; 0,-0.5 0,0.5 ; -7.05,-9.05 -7.05,9.05 7.05,9.05 7.05,-9.05 -7.05,-9.05
Mechanical 21:
  lines w0.001: -5,-7 -5,7 5,7 5,-7 -5,-7
3D body "BGA117C100P9X13_1000X1400X154.stp": height 1.54, standoff 0, extent -5,-7 5,7